# Altium footprint library PCB1.PcbLib: 54 footprints (part 2 of 4)
Each footprint in its own frame and in the unit in brackets; x right, y up, seen from the top. Pads: shape width x height; smd on the part's side, far side on the other; paste and mask are expansions set on the pad; w line width, h text height; cw(c..) or ccw(c..) is an arc to the next point about the centre after c.
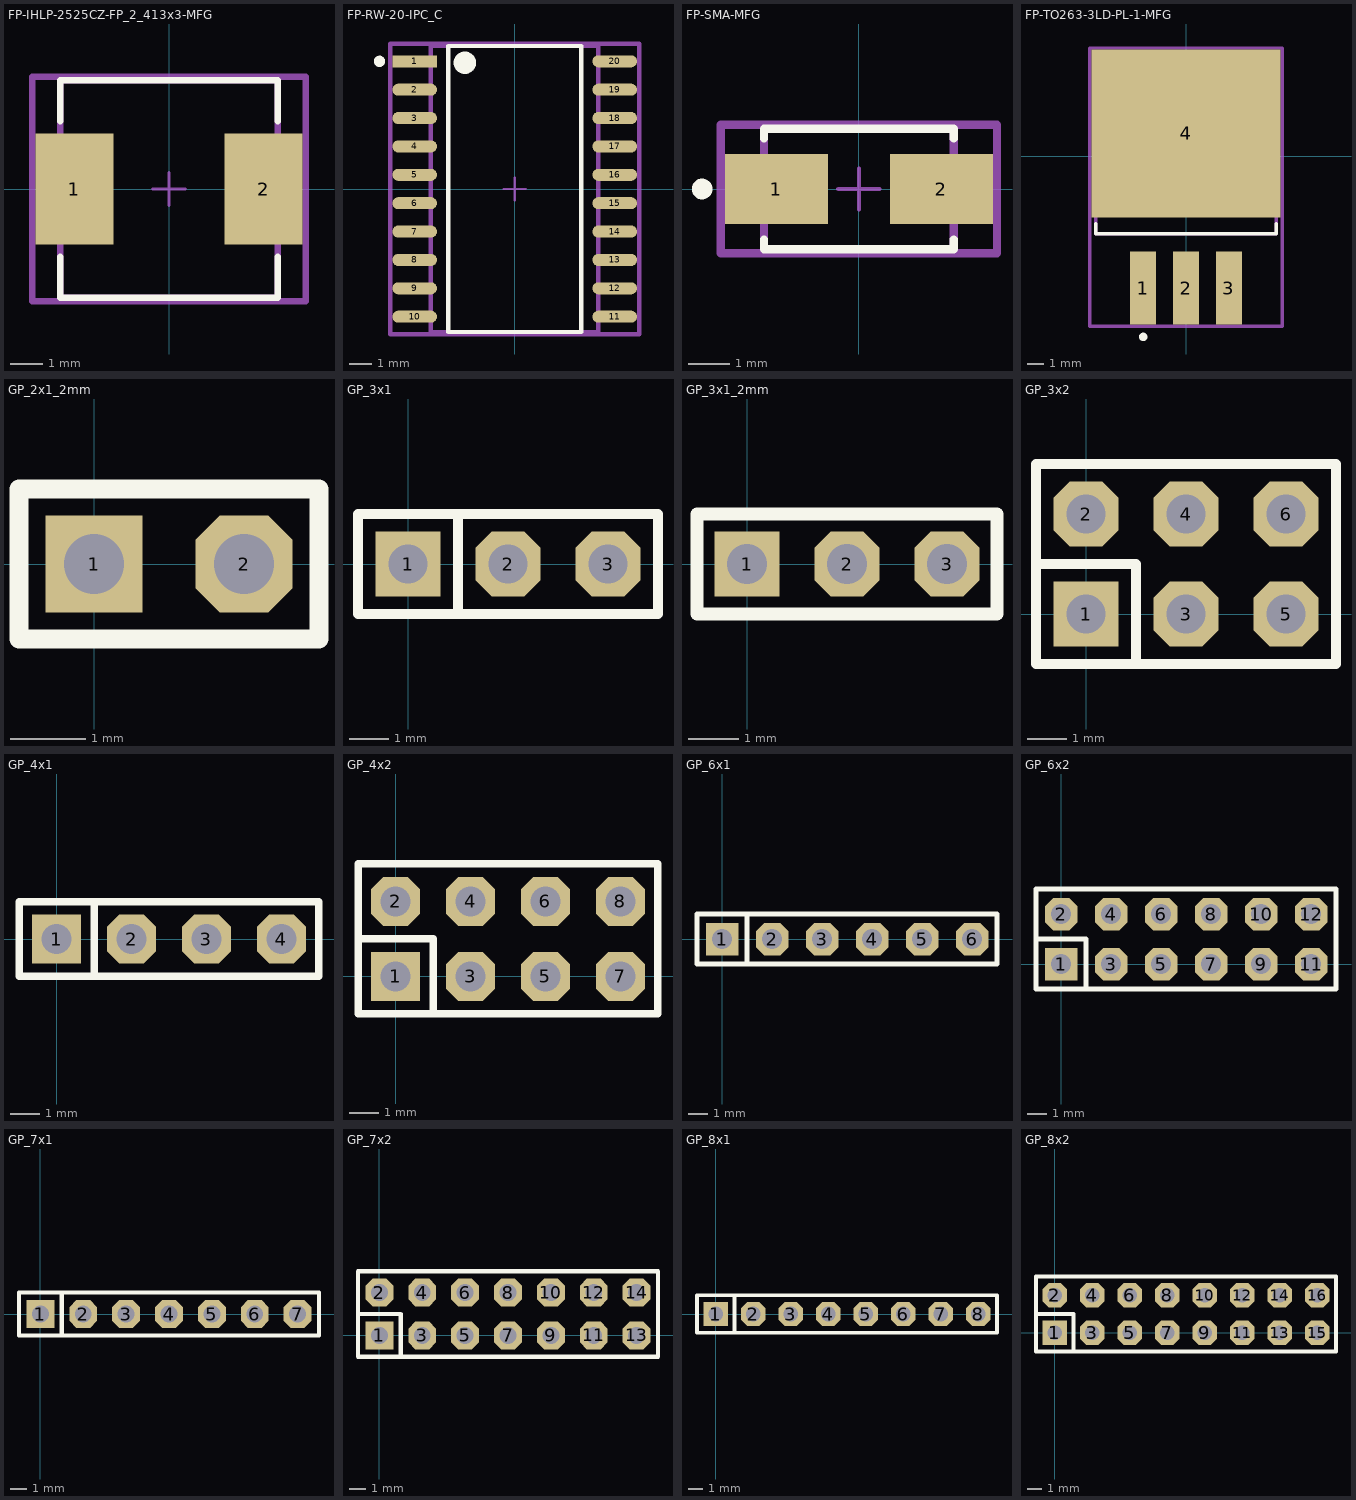
[diagram p1: the footprints below, top view; thin cyan lines are the x and y axes]

## FP-IHLP-2525CZ-FP_2_413x3-MFG [mil]
pads (2):
  rect 95x135 smd paste+0 mask+0: 1(-115,0) 2(115,0)
Top Overlay:
  lines w7.87: -132.36,-82.26 -132.36,-132.36 132.36,-132.36 132.36,-82.26 ; -132.36,82.26 -132.36,132.36 132.36,132.36 132.36,82.26
Top 3D Body:
  lines w7.87: -132.36,-132.36 132.36,-132.36 132.36,132.36 -132.36,132.36 -132.36,-132.36
Top Courtyard:
  lines w7.87: -166.44,-136.3 166.44,-136.3 166.44,136.3 -166.44,136.3 -166.44,-136.3
Top Assembly:
  lines w7.87: -166.44,-136.3 166.44,-136.3 166.44,136.3 -166.44,136.3 -166.44,-136.3
  text ".Designator" at 0,7.39 h39.37
Top Component Center:
  lines w3.94: -19.68,0 19.68,0 ; 0,-19.68 0,19.68
3D body "Ind_Vishay_IHLP2525CZER1R5M5A_eec.STEP": height 10, standoff 0, extent -166.44,-136.3 166.44,136.3

## FP-RW-20-IPC_C [mm]
pads (20):
  rect 1.998x0.542 smd paste+0 mask+0: 1(-4.478,5.715)
  rrect100% 1.998x0.542 smd paste+0 mask+0: 2(-4.478,4.445) 3(-4.478,3.175) 4(-4.478,1.905) 5(-4.478,0.635) 6(-4.478,-0.635) 7(-4.478,-1.905) 8(-4.478,-3.175) 9(-4.478,-4.445) 10(-4.478,-5.715) 11(4.478,-5.715) 12(4.478,-4.445) 13(4.478,-3.175) 14(4.478,-1.905) 15(4.478,-0.635) 16(4.478,0.635) 17(4.478,1.905) 18(4.478,3.175) 19(4.478,4.445) 20(4.478,5.715)
Top Overlay:
  circle w0.25: c-6.052,5.715 r0.125
  circle w0.5: c-2.229,5.65 r0.25
  lines w0.2: -2.979,-6.4 -2.979,6.4 2.979,6.4 2.979,-6.4 -2.979,-6.4
Top 3D Body:
  lines w0.2: -3.75,-6.4 -3.75,6.4 3.75,6.4 3.75,-6.4 -3.75,-6.4
Top Courtyard:
  lines w0.2: -5.577,-6.5 -5.577,6.5 5.577,6.5 5.577,-6.5 -5.577,-6.5
Top Assembly:
  lines w0.2: -5.577,-6.5 -5.577,6.5 5.577,6.5 5.577,-6.5 -5.577,-6.5
  text ".Designator" at 0,0.188 h1
Top Component Center:
  lines w0.1: -0.5,0 0.5,0 ; 0,-0.5 0,0.5
3D body "IC_Analog_Devices_ADM2587EBRWZ-REEL7_eec.STEP": height 0.25, standoff 0, extent -5.577,-6.5 5.577,6.5

## FP-SMA-MFG [mm]
pads (2):
  rect 2.5x1.7 smd paste+0 mask+0: 1(-2,0) 2(2,0)
Top Overlay:
  circle w0.25: c-3.8,0 r0.125
  lines w0.2: -2.3,-1.225 -2.3,-1.46 2.3,-1.46 2.3,-1.225 ; -2.3,1.225 -2.3,1.46 2.3,1.46 2.3,1.225
Top 3D Body:
  lines w0.2: -2.3,-1.46 2.3,-1.46 2.3,1.46 -2.3,1.46 -2.3,-1.46
Top Courtyard:
  lines w0.2: -3.35,-1.56 3.35,-1.56 3.35,1.56 -3.35,1.56 -3.35,-1.56
Top Assembly:
  lines w0.2: -3.35,-1.56 3.35,-1.56 3.35,1.56 -3.35,1.56 -3.35,-1.56
  text ".Designator" at 0,0.188 h1
Top Component Center:
  lines w0.1: -0.5,0 0.5,0 ; 0,-0.5 0,0.5
3D body "Diode_Diodes_Inc_SBRT5A50SA-13_eec.STEP": height 0.25, standoff 0, extent -3.35,-1.56 3.35,1.56

## FP-TO263-3LD-PL-1-MFG [mil]
pads (4):
  rect 60x170 smd paste+0 mask+0: 1(-100,-306.75) 2(0,-306.75) 3(100,-306.75)
  rect 440x390 smd paste+0 mask+0: 4(0,53.25)
Top Overlay:
  circle w9.84: c-99.76,-420.29 r4.92
  lines w7.87: -210,-156.52 -210,-180.5 210,-180.5 210,-156.52
Top 3D Body:
  lines w7.87: -210,-180.5 210,-180.5 210,180.5 -210,180.5 -210,-180.5
Top Courtyard:
  lines w7.87: -223.94,-395.69 223.94,-395.69 223.94,252.19 -223.94,252.19 -223.94,-395.69
Top Assembly:
  lines w7.87: -223.94,-395.69 223.94,-395.69 223.94,252.19 -223.94,252.19 -223.94,-395.69
  text ".Designator" at 0,-71.77 h39.37
Top Component Center:
  lines w3.94: -19.68,0 19.68,0 ; 0,-19.68 0,19.68
3D body "IC_Microchip_MIC29300-3_3WU-TR_eec.STEP": height 10, standoff 0, extent -223.94,-395.69 223.94,252.19

## GP_2x1_2mm [mm]
pads (2):
  rect 1.3x1.3 hole 0.8: 1(0,0)
  oct 1.3x1.3 hole 0.8: 2(2,0)
Top Overlay:
  lines w0.254: -1,-1 -1,1 3,1 3,-1 -1,-1
3D body "Samtec-TMM-102-03-G-S.STEP": height 5.51, standoff -2.69, extent -1,-0.99 3,0.991

## GP_3x1 [mil]
pads (3):
  rect 65x65 hole 39.37: 1(0,0)
  oct 65x65 hole 39.37: 2(100,0) 3(200,0)
Top Overlay:
  lines w10: 50,-50 50,50 ; -50,-50 -50,-19.68 -50,50 250,50 250,-50 -50,-50
3D body "Samtec-TSW-103-23-F-S.STEP": height 330, standoff -115, extent -50,-50 250,50

## GP_3x1_2mm [mm]
pads (3):
  rect 1.3x1.3 hole 0.8: 1(0,0)
  oct 1.3x1.3 hole 0.8: 2(2,0) 3(4,0)
Top Overlay:
  lines w0.254: -1,-1 5,-1 5,1 -1,1 -1,-1
3D body "Samtec-TMM-103-03-G-S.STEP": height 5.51, standoff -2.69, extent -1,-0.99 5,0.991

## GP_3x2 [mil]
pads (6):
  rect 65x65 hole 39.37: 1(0,0)
  oct 65x65 hole 39.37: 2(0,100) 3(100,0) 4(100,100) 5(200,0) 6(200,100)
Top Overlay:
  lines w10: -50,50 50,50 50,-50 ; -50,-50 -50,150 250,150 250,-50 -50,-50
3D body "Samtec-TSW-103-23-F-D.STEP": height 330, standoff -115, extent -50,-50 250,150

## GP_4x1 [mil]
pads (4):
  rect 65x65 hole 39.37: 1(0,0)
  oct 65x65 hole 39.37: 2(100,0) 3(200,0) 4(300,0)
Top Overlay:
  lines w10: 50,-50 50,50 ; -50,-50 350,-50 350,50 -50,50 -50,-50
3D body "Samtec-TSW-104-23-F-S.STEP": height 330, standoff -115, extent -50,-50 350,50

## GP_4x2 [mil]
pads (8):
  rect 65x65 hole 39.37: 1(0,0)
  oct 65x65 hole 39.37: 2(0,100) 3(100,0) 4(100,100) 5(200,0) 6(200,100) 7(300,0) 8(300,100)
Top Overlay:
  lines w10: -50,50 50,50 50,-50 ; -50,-50 350,-50 350,150 -50,150 -50,-50
3D body "Samtec-TSW-104-23-F-D.STEP": height 330, standoff -115, extent -50,-50 350,150

## GP_6x1 [mil]
pads (6):
  rect 65x65 hole 39.37: 1(0,0)
  oct 65x65 hole 39.37: 2(100,0) 3(200,0) 4(300,0) 5(400,0) 6(500,0)
Top Overlay:
  lines w10: 50,-50 50,50 ; -50,-50 550,-50 550,50 -50,50 -50,-50
3D body "Samtec-TSW-106-23-F-S.STEP": height 330, standoff -115, extent -50,-50 550,50

## GP_6x2 [mil]
pads (12):
  rect 65x65 hole 39.37: 1(0,0)
  oct 65x65 hole 39.37: 2(0,100) 3(100,0) 4(100,100) 5(200,0) 6(200,100) 7(300,0) 8(300,100) 9(400,0) 10(400,100) 11(500,0) 12(500,100)
Top Overlay:
  lines w10: -50,50 50,50 50,-50 ; -50,-50 550,-50 550,150 -50,150 -50,-50
3D body "Samtec-TSW-106-23-F-D.STEP": height 330, standoff -115, extent -50,-50 550,150

## GP_7x1 [mil]
pads (7):
  rect 65x65 hole 39.37: 1(0,0)
  oct 65x65 hole 39.37: 2(100,0) 3(200,0) 4(300,0) 5(400,0) 6(500,0) 7(600,0)
Top Overlay:
  lines w10: 50,-50 50,50 ; -50,-50 -50,50 650,50 650,-50 -50,-50
3D body "Samtec-TSW-107-23-F-S.STEP": height 330, standoff -115, extent -50,-50 650,50

## GP_7x2 [mil]
pads (14):
  rect 65x65 hole 39.37: 1(0,0)
  oct 65x65 hole 39.37: 2(0,100) 3(100,0) 4(100,100) 5(200,0) 6(200,100) 7(300,0) 8(300,100) 9(400,0) 10(400,100) 11(500,0) 12(500,100) 13(600,0) 14(600,100)
Top Overlay:
  lines w10: -50,50 50,50 50,-50 ; -50,-50 650,-50 650,150 -50,150 -50,-50
3D body "Samtec-TSW-107-23-F-D.STEP": height 330, standoff -115, extent -50,-50 650,150

## GP_8x1 [mil]
pads (8):
  rect 65x65 hole 39.37: 1(0,0)
  oct 65x65 hole 39.37: 2(100,0) 3(200,0) 4(300,0) 5(400,0) 6(500,0) 7(600,0) 8(700,0)
Top Overlay:
  lines w10: 50,-50 50,50 ; -50,-50 -50,50 750,50 750,-50 -50,-50
3D body "Samtec-TSW-108-23-F-S.STEP": height 330, standoff -115, extent -50,-50 750,50

## GP_8x2 [mil]
pads (16):
  rect 65x65 hole 39.37: 1(0,0)
  oct 65x65 hole 39.37: 2(0,100) 3(100,0) 4(100,100) 5(200,0) 6(200,100) 7(300,0) 8(300,100) 9(400,0) 10(400,100) 11(500,0) 12(500,100) 13(600,0) 14(600,100) 15(700,0) 16(700,100)
Top Overlay:
  lines w10: -50,50 50,50 50,-50 ; -50,-50 750,-50 750,150 -50,150 -50,-50
3D body "Samtec-TSW-108-23-F-D.STEP": height 330, standoff -115, extent -50,-50 750,150